# Altium integrated library BEAGLEBONEBLACK.IntLib: 1 symbol
Pins are listed as number, name and electrical type; pins without a type are passive.

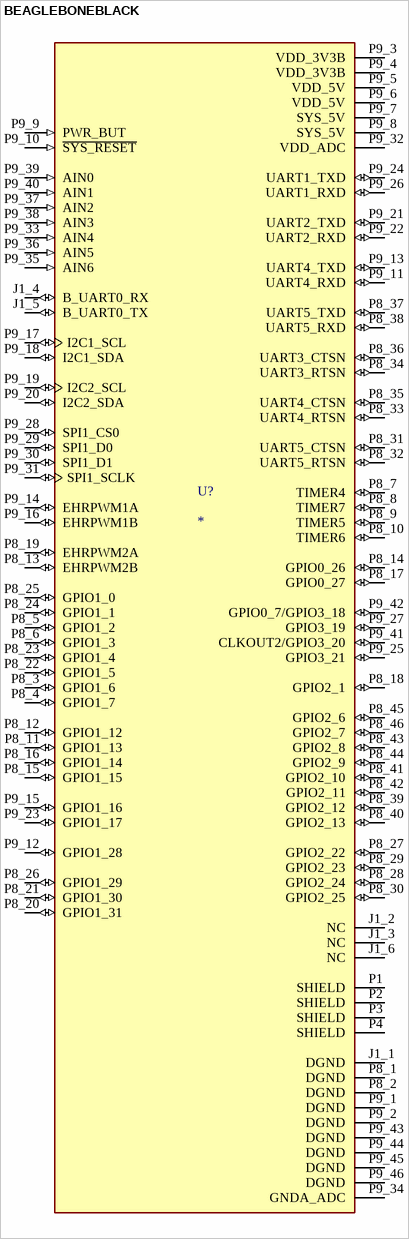
[diagram p0: symbol BEAGLEBONEBLACK]

## BEAGLEBONEBLACK
designator U?
AM3358 Microprocessor Development Board 1000MHz CPU 512MB RAM 4GB eMMC Flash; MP: BEAGLEBONE BLACK; MF: Seeed Development Limited; Availability: Unavailable; Price: None; Check_prices: https://www.snapeda.com/parts/BEAGLEBONE%20BLACK/Bearings%20Limited/view-part/5296767/?ref=eda; Package: None; SnapEDA_Link: https://www.snapeda.com/parts/BEAGLEBONE%20BLACK/Bearings%20Limited/view-part/5296767/?ref=snap; Value: *
footprint MODULE_BEAGLEBONEBLACK (Footprint not found)
footprint MODULE_BEAGLEBONEBLACK
pins: J1_1 DGND (power), J1_2 NC, J1_3 NC, J1_4 B_UART0_RX (io), J1_5 B_UART0_TX (io), J1_6 NC, P1 SHIELD, P2 SHIELD, P3 SHIELD, P4 SHIELD, P8_1 DGND (power), P8_2 DGND (power), P8_3 GPIO1_6 (io), P8_4 GPIO1_7 (io), P8_5 GPIO1_2 (io), P8_6 GPIO1_3 (io), P8_7 TIMER4 (io), P8_8 TIMER7 (io), P8_9 TIMER5 (io), P8_10 TIMER6 (io), P8_11 GPIO1_13 (io), P8_12 GPIO1_12 (io), P8_13 EHRPWM2B (io), P8_14 GPIO0_26 (io), P8_15 GPIO1_15 (io), P8_16 GPIO1_14 (io), P8_17 GPIO0_27 (io), P8_18 GPIO2_1 (io), P8_19 EHRPWM2A (io), P8_20 GPIO1_31 (io), P8_21 GPIO1_30 (io), P8_22 GPIO1_5 (io), P8_23 GPIO1_4 (io), P8_24 GPIO1_1 (io), P8_25 GPIO1_0 (io), P8_26 GPIO1_29 (io), P8_27 GPIO2_22 (io), P8_28 GPIO2_24 (io), P8_29 GPIO2_23 (io), P8_30 GPIO2_25 (io), P8_31 UART5_CTSN (io), P8_32 UART5_RTSN (io), P8_33 UART4_RTSN (io), P8_34 UART3_RTSN (io), P8_35 UART4_CTSN (io), P8_36 UART3_CTSN (io), P8_37 UART5_TXD (io), P8_38 UART5_RXD (io), P8_39 GPIO2_12 (io), P8_40 GPIO2_13 (io), P8_41 GPIO2_10 (io), P8_42 GPIO2_11 (io), P8_43 GPIO2_8 (io), P8_44 GPIO2_9 (io), P8_45 GPIO2_6 (io), P8_46 GPIO2_7 (io), P9_1 DGND (power), P9_2 DGND (power), P9_3 VDD_3V3B (power), P9_4 VDD_3V3B (power), P9_5 VDD_5V (power), P9_6 VDD_5V (power), P9_7 SYS_5V (power), P9_8 SYS_5V (power), P9_9 PWR_BUT (in), P9_10 ~{SYS_RESET} (in), P9_11 UART4_RXD (io), P9_12 GPIO1_28 (io), P9_13 UART4_TXD (io), P9_14 EHRPWM1A (io), P9_15 GPIO1_16 (io), P9_16 EHRPWM1B (io), P9_17 I2C1_SCL (io), P9_18 I2C1_SDA (io), P9_19 I2C2_SCL (io), P9_20 I2C2_SDA (io), P9_21 UART2_TXD (io), P9_22 UART2_RXD (io), P9_23 GPIO1_17 (io), P9_24 UART1_TXD (io), P9_25 GPIO3_21 (io), P9_26 UART1_RXD (io), P9_27 GPIO3_19 (io), P9_28 SPI1_CS0 (io), P9_29 SPI1_D0 (io), P9_30 SPI1_D1 (io), P9_31 SPI1_SCLK (io), P9_32 VDD_ADC (power), P9_33 AIN4 (in), P9_34 GNDA_ADC (power), P9_35 AIN6 (in), P9_36 AIN5 (in), P9_37 AIN2 (in), P9_38 AIN3 (in), P9_39 AIN0 (in), P9_40 AIN1 (in), P9_41 CLKOUT2/GPIO3_20 (io), P9_42 GPIO0_7/GPIO3_18 (io), P9_43 DGND (power), P9_44 DGND (power), P9_45 DGND (power), P9_46 DGND (power)